# Altium footprint library TomvanRijn-PCB.PcbLib: 165 footprints (part 1 of 11)
Each footprint in its own frame and in the unit in brackets; x right, y up, seen from the top. Pads: shape width x height; smd on the part's side, far side on the other; paste and mask are expansions set on the pad; w line width, h text height; cw(c..) or ccw(c..) is an arc to the next point about the centre after c.
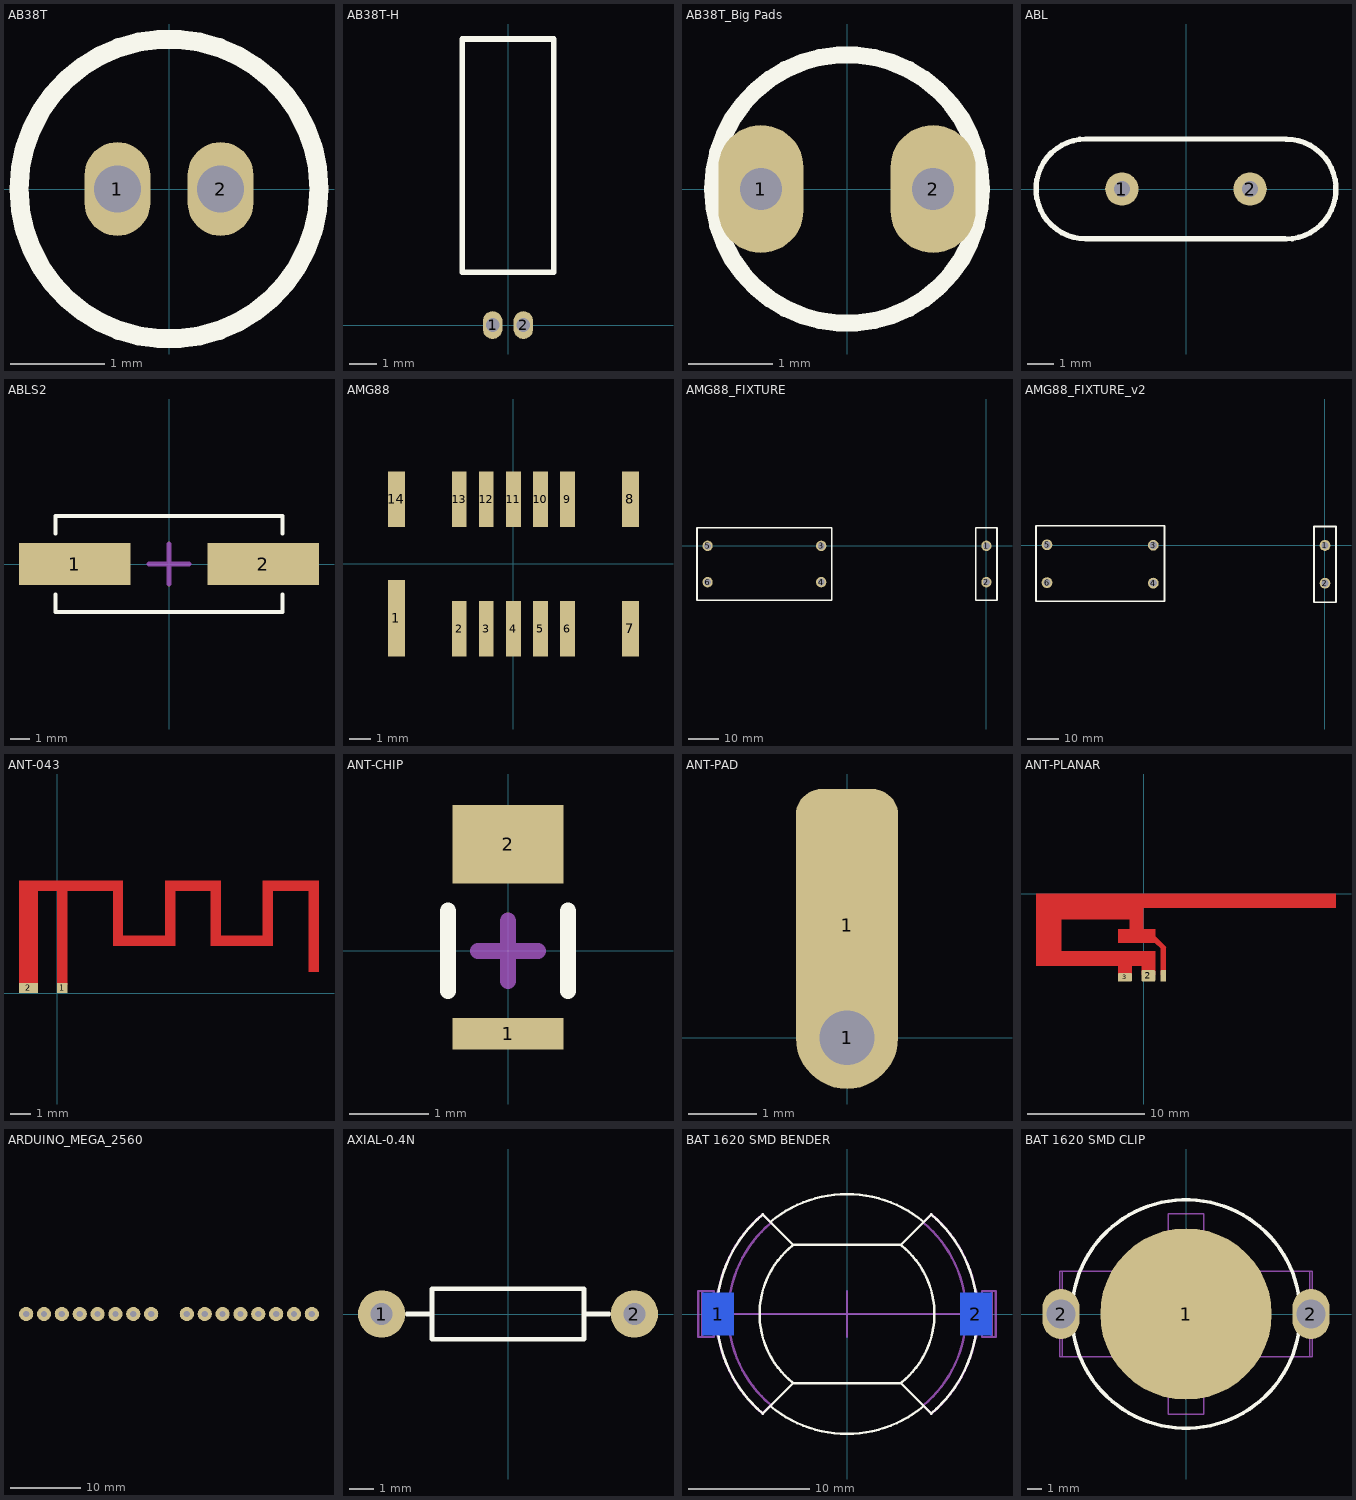
[diagram p0: the footprints below, top view; thin cyan lines are the x and y axes]

## AB38T [mm] "Crystal, Through Hole, 3.2 x 8.3 mm body, 1.1 mm pitch"
height 8.3
pads (2):
  oval 0.7x1 hole 0.5: 1(-0.55,0) 2(0.55,0)
Top Overlay:
  circle w0.203: c0,0 r1.6
3D body: height 1, standoff -2, extent 0.352,-0.199 0.75,0.2
3D body: height 1, standoff -2, extent -0.748,-0.199 -0.35,0.2
3D body: height 9.7, standoff 0.7, extent -1.587,-1.597 1.6,1.597

## AB38T-H [mm] "Crystal, Through Hole, 3.2 x 8.3 mm body, 1.1 mm pitch, Right angle"
height 8.3
pads (2):
  oval 0.7x1 hole 0.5: 1(-0.55,0) 2(0.55,0)
Top Overlay:
  lines w0.203: -1.651,1.905 1.651,1.905 1.651,10.287 -1.651,10.287 -1.651,1.905
3D body: height 3.19, standoff 0, extent -1.597,1.905 1.597,10.205
3D body: height 1.6, standoff -2.4, extent -0.75,-0.198 -0.35,0.2
3D body: height 1.6, standoff -2.4, extent 0.35,-0.198 0.75,0.2
3D body: height 1.8, standoff 1.4, extent -0.75,0 -0.35,4
3D body: height 1.8, standoff 1.4, extent 0.35,0 0.75,4
3D body: height 3.19, standoff 0, extent -1.597,1.705 1.597,1.905
3D body: height 1.8, standoff 1.4, extent -0.748,-0.199 -0.35,0.199
3D body: height 1.8, standoff 1.4, extent 0.352,-0.199 0.75,0.199

## AB38T_Big Pads [mm] "Crystal, Through Hole, 3.2 x 8.3 mm body, 1.1 mm pitch"
height 8.3
pads (2):
  oval 1.016x1.524 hole 0.5: 1(-1.025,0) 2(1.025,0)
Top Overlay:
  circle w0.203: c0,0 r1.6
3D body: height 1, standoff -2, extent 0.827,-0.199 1.225,0.2
3D body: height 9.7, standoff 0.7, extent -1.612,-1.672 1.575,1.522
3D body: height 1, standoff -2, extent -1.223,-0.199 -0.825,0.2

## ABL [mm] "Crystal, Through Hole, 10.3 x 3.8 mm body, 4.88 mm pitch"
height 3.5
pads (2):
  round 1.27 hole 0.6: 1(-2.44,0) 2(2.44,0)
Top Overlay:
  lines w0.203: 3.765,-1.895 -3.81,-1.895 cw(c-3.81,0.005) -3.81,1.905 3.775,1.905 ; 3.81,-1.9 ccw(c3.81,0) 3.81,1.9
3D body "User Library-HP49US.step": height 3.5, standoff -4, extent -5.675,-2.286 5.675,2.364

## ABLS2 [mm] "Crystal, SMD, body 450 x 190 mil"
height 0.75
pads (2):
  rect 5.6x2.1 smd: 1(-4.75,0) 2(4.75,0)
Top Overlay:
  lines w0.203: -5.715,-1.524 -5.715,-2.413 5.715,-2.413 5.715,-1.524 ; -5.715,1.524 -5.715,2.413 5.715,2.413 5.715,1.524
Mechanical 15:
  lines w0.254: -1.016,0 1.016,0 ; 0,-1.016 0,1.016
3D body "User Library-SMU4.STEP": height 3.92, standoff -0.08, extent -6.259,-2.4 6.241,2.4

## AMG88 [mm] "8x8 IR Sensor - Grid Eye - Panasonic"
height 4.267
pads (14):
  rect 0.8x3.6 smd: 1(-5.5,-2.55)
  rect 0.7x2.6 smd: 2(-2.54,-3.05) 3(-1.27,-3.05) 4(0,-3.05) 5(1.27,-3.05) 6(2.54,-3.05) 9(2.54,3.05) 10(1.27,3.05) 11(0,3.05) 12(-1.27,3.05) 13(-2.54,3.05)
  rect 0.8x2.6 smd: 7(5.5,-3.05) 8(5.5,3.05) 14(-5.5,3.05)
3D body "Grid-EYE.stp": height 4.36, standoff 0, extent -5.8,-4 5.8,4

## AMG88_FIXTURE [mil] "Fixture for 3 AMG88 sensor boards"
pads (6):
  round 135 hole 90.55 unplated: 1(0,0) 2(0,-473.82) 3(-2157.08,0) 4(-2157.07,-473.82) 5(-3641.4,0) 6(-3641.33,-473.82)
Top Overlay:
  lines w20: -3779.39,-710.13 -3779.39,237.34 ; -3779.39,-710.13 -3779.38,-710.14 ; -3779.38,-710.14 -2019.96,-710.14 -2019.96,237.33 -3779.38,237.33 ; -3779.39,237.34 -3779.38,237.33 ; -137.45,-710.76 -137.45,236.53 -137.1,236.88 138.16,236.88 138.16,-710.77 138.14,-710.79 -137.42,-710.79 -137.45,-710.76
3D body "PCB Fixture slide and holes.step": height 432.87, standoff 1.77, extent -3778.76,-710.77 138.17,236.87

## AMG88_FIXTURE_v2 [mil] "Fixture for 3 AMG88 sensor boards"
pads (6):
  round 135 hole 90.55 unplated: 1(0,0) 2(0,-473.82) 3(-2152.63,1.72) 4(-2152.63,-472.1) 5(-3484.69,7.98) 6(-3484.63,-465.84)
Top Overlay:
  lines w20: -3622.69,-702.15 -3622.69,245.32 ; -3622.68,-702.16 -2011.22,-702.16 -2011.22,245.31 -3622.68,245.31 ; -3622.69,-702.15 -3622.68,-702.16 ; -3622.69,245.32 -3622.68,245.31 ; -137.45,-710.76 -137.45,236.53 -137.1,236.88 138.16,236.88 138.16,-710.77 138.14,-710.79 -137.42,-710.79 -137.45,-710.76
3D body "Grid Eye Full Assembly.step": height 1524.51, standoff 5.08, extent -3629,-709 136.35,238.64

## ANT-043 [mm] "Antenna, planar, 15 x 7 mm, 2.4 GHz"
pads (2):
  rect 0.5x0.5 smd paste-2.54 mask-2.54: 1(0.25,0.25)
  rect 0.9x0.5 smd paste-2.54 mask-2.54: 2(-1.375,0.25)
Top Layer:
  rectangle: 12.073,1.016 12.573,4.956
  rectangle: 9.874,4.9 12.574,5.4
  rectangle: 7.874,2.26 9.874,2.76
  rectangle: 3.175,2.26 5.175,2.76
  rectangle: 5.175,4.9 7.875,5.4
  rectangle: 9.874,2.26 10.374,4.9
  rectangle: 7.375,2.26 7.875,4.9
  rectangle: 5.175,2.26 5.675,4.9
  rectangle: 2.675,2.26 3.175,4.9
  rectangle: -1.825,4.9 3.175,5.4
  rectangle: 0,0.381 0.5,4.9
  rectangle: -1.825,0.381 -0.925,4.9

## ANT-CHIP [mm] "Antenna, 2012, 2 leads"
height 1
pads (2):
  rect 1.4x0.4 smd: 1(0,-1.05)
  rect 1.4x1 smd: 2(0,1.35)
Top Overlay:
  lines w0.203: -0.762,-0.508 -0.762,0.508 ; 0.762,-0.508 0.762,0.508
Mechanical 15:
  lines w0.203: -0.381,0 0.381,0 ; 0,-0.381 0,0.381
3D body "2012-antenna.step": height 0.6, standoff 0, extent -0.625,-1 0.625,1

## ANT-PAD [mm] "Antenna pad"
pads (2):
  round 1.5 hole 0.8 paste-25.4: 1(0,0)
  rrect50% 1.5x4 smd paste-25.4: 1(0,1.651)

## ANT-PLANAR [mm] "Reverse F-Antenna for 2.4GHz"
pads (3):
  rrect30% 0.46x1 smd paste-5 mask-5: 1(1.676,-7.01)
  rrect30% 1.2x1 smd paste-5 mask-5: 2(0.406,-7.01)
  rrect30% 1.2x0.74 smd paste-5 mask-5: 3(-1.6,-7.137)
Top Layer:
  rectangle: 1.45,-6.91 1.91,-4.563
  rectangle: -2.2,-4.22 1,-3.01
  rectangle: -1.2,-3.01 0,-2.21
  rectangle: 0,-1.21 16.4,0
  rectangle: -7,-2.21 0,0
  rectangle: -9.18,-6.17 -7,0
  rectangle: -7,-6.17 1,-4.88
  rectangle: -0.2,-6.91 1,-6.17
  rectangle: -2.2,-6.91 -1,-6.17
  region: 1.91,-4.563 1,-3.652 1,-4.22 1.45,-4.67 1.45,-4.563

## ARDUINO_MEGA_2560 [mil] "Arduino Mega 2560 PCB Board for breakout pins"
pads (16):
  round 80 hole 35.43: ADC0(2800,-2060) ADC1(2900,-2060) ADC2(3000,-2060) ADC3(3100,-2060) ADC4(3200,-2060) ADC5(3300,-2060) ADC6(3400,-2060) ADC7(3500,-2060) ADC8(3700,-2060) ADC9(3800,-2060) ADC10(3900,-2060) ADC11(4000,-2060) ADC12(4100,-2060) ADC13(4200,-2060) ADC14(4300,-2060) ADC15(4400,-2060)
3D body "arduino_MEGA2650.STEP": height 435.04, standoff -165.35, extent 550,-2160 4800,-60

## AXIAL-0.4N [mil] "Axial Device, Thru-Hole; 2 Leads; 0.4 in Pin Spacing"
height 80
pads (2):
  round 75 hole 35: 1(-200,0) 2(200,0)
Top Overlay:
  lines w7.87: -160,0 -120,0 ; 120,0 160,0 ; -120,-40 120,-40 120,40 -120,40 -120,-40
3D body "User Library-RESISTOR, 0_25 W, 0_4 IN LEAD PITCH.step": height 115.5, standoff -100, extent -211.99,-45.5 212.01,45.5

## BAT 1620 SMD BENDER [mm] "Battery holder, CR1620, SMD, bended around board edges"
height 5.3
pads (2):
  rect 2.6x3.5 smd far side: 1(-10.668,0) 2(10.668,0)
Top Overlay:
  lines w0.203: -6.973,-8.241 -6.971,-8.241 -4.445,-5.715 ; -6.973,-8.241 cw(c0,0) -6.973,8.241 -6.971,8.241 -4.445,5.715 ; -6.35,-7.62 ccw(c0,0) 6.35,-7.62 ; -6.35,7.62 cw(c0,0) 6.35,7.62 ; 6.973,-8.241 ccw(c0,0) 6.973,8.241 ; 6.973,-8.241 6.971,-8.241 4.445,-5.715 ; 6.973,8.241 6.971,8.241 4.445,5.715 ; -4.445,-5.715 cw(c0,0) -4.445,5.715 ; -4.445,-5.715 4.445,-5.715 ; -4.445,5.715 4.445,5.715 ; 4.445,-5.715 ccw(c0,0) 4.445,5.715
Mechanical 1:
  lines w0.203: -10.922,0 10.922,0 ; -12.002,-1.905 -11.049,-1.905 -11.049,1.905 -12.002,1.905 ; -12.002,-1.905 -12.002,1.905 ; -12.002,-1.905 -12.319,-1.905 -12.319,1.905 -12.002,1.905 ; 12.002,-1.905 11.176,-1.905 11.176,1.905 12.002,1.905 ; 12.002,-1.905 12.002,1.905 ; 12.002,-1.905 12.319,-1.905 12.319,1.905 12.002,1.905 ; -6.985,-8.255 cw(c0,0) -6.985,8.255 -6.288,7.558 -6.288,7.545 ccw(c0,0) -6.288,-7.545 -6.985,-8.242 -6.985,-8.255 ; 6.313,-7.583 6.313,-7.576 ccw(c0,0) 6.313,7.576 6.313,7.583 6.985,8.255 cw(c0,0) 6.985,-8.255 6.313,-7.583
  lines w0.254: -10.668,-1.905 cw(c0,0) -10.668,1.905 ; 10.668,-1.905 ccw(c0,0) 10.668,1.905
Mechanical 15:
  lines w0.203: -1.905,0 1.905,0 ; 0,-1.905 0,1.905
3D body: height -0.5, standoff -0.8, extent 11.177,-1.904 12.001,1.904
3D body: height -0.5, standoff -0.8, extent -12.001,-1.904 -11.05,1.904
3D body: height 0.3, standoff -0.8, extent 12.002,-1.904 12.318,1.904
3D body: height 0.3, standoff -0.8, extent -12.318,-1.904 -12.002,1.904
3D body: height 1, standoff 0, extent -10.796,-8.241 10.796,8.241
3D body: height 0.3, standoff 0, extent 10.667,-1.906 12.319,1.906
3D body: height 0.3, standoff 0, extent -12.319,-1.906 -10.667,1.906
3D body: height 5.3, standoff 0, extent 6.313,-8.256 10.814,8.256
3D body: height 5.3, standoff 0, extent -10.813,-8.254 -6.288,8.254

## BAT 1620 SMD CLIP [mm] "Battery holder, CR1620, SMD"
height 4
pads (3):
  round 12 smd paste-2000: 1(0,0)
  oval 2.6x3.5 hole 2: 2(-8.75,0) 2(8.75,0)
Top Overlay:
  circle w0.254: c0,0 r8
Mechanical 1:
  lines w0.1: -8.85,-3 -8.85,3 ; -8.85,-3 -8.65,-3 -8.65,3 -8.85,3 ; -8.85,-3 8.85,-3 ; -8.85,3 8.85,3 ; 8.85,-3 8.85,3 ; 8.85,-3 8.65,-3 8.65,3 8.85,3 ; -1.25,-7 -1.25,7 1.25,7 1.25,-7 -1.25,-7
Mechanical 15:
  lines w0.203: -1.016,0 1.016,0 ; 0,-1.016 0,1.016
3D body: height 0, standoff -3, extent 8.254,-0.499 9.25,0.499
3D body: height 0, standoff -3, extent -9.246,-0.499 -8.25,0.499
3D body: height 4, standoff 3.8, extent -1.249,-6.999 1.249,-3.001
3D body: height 4, standoff 3.8, extent -1.249,3.001 1.249,6.999
3D body: height 4, standoff 0, extent -8.849,-2.999 -8.651,2.999
3D body: height 4, standoff 0, extent 8.651,-2.999 8.849,2.999
3D body: height 4, standoff 3.8, extent -8.649,-2.999 8.649,2.999